# Altium footprint library ATROTECH.PcbLib: 334 footprints (part 6 of 21)
Each footprint in its own frame and in the unit in brackets; x right, y up, seen from the top. Pads: shape width x height; smd on the part's side, far side on the other; paste and mask are expansions set on the pad; w line width, h text height; cw(c..) or ccw(c..) is an arc to the next point about the centre after c.
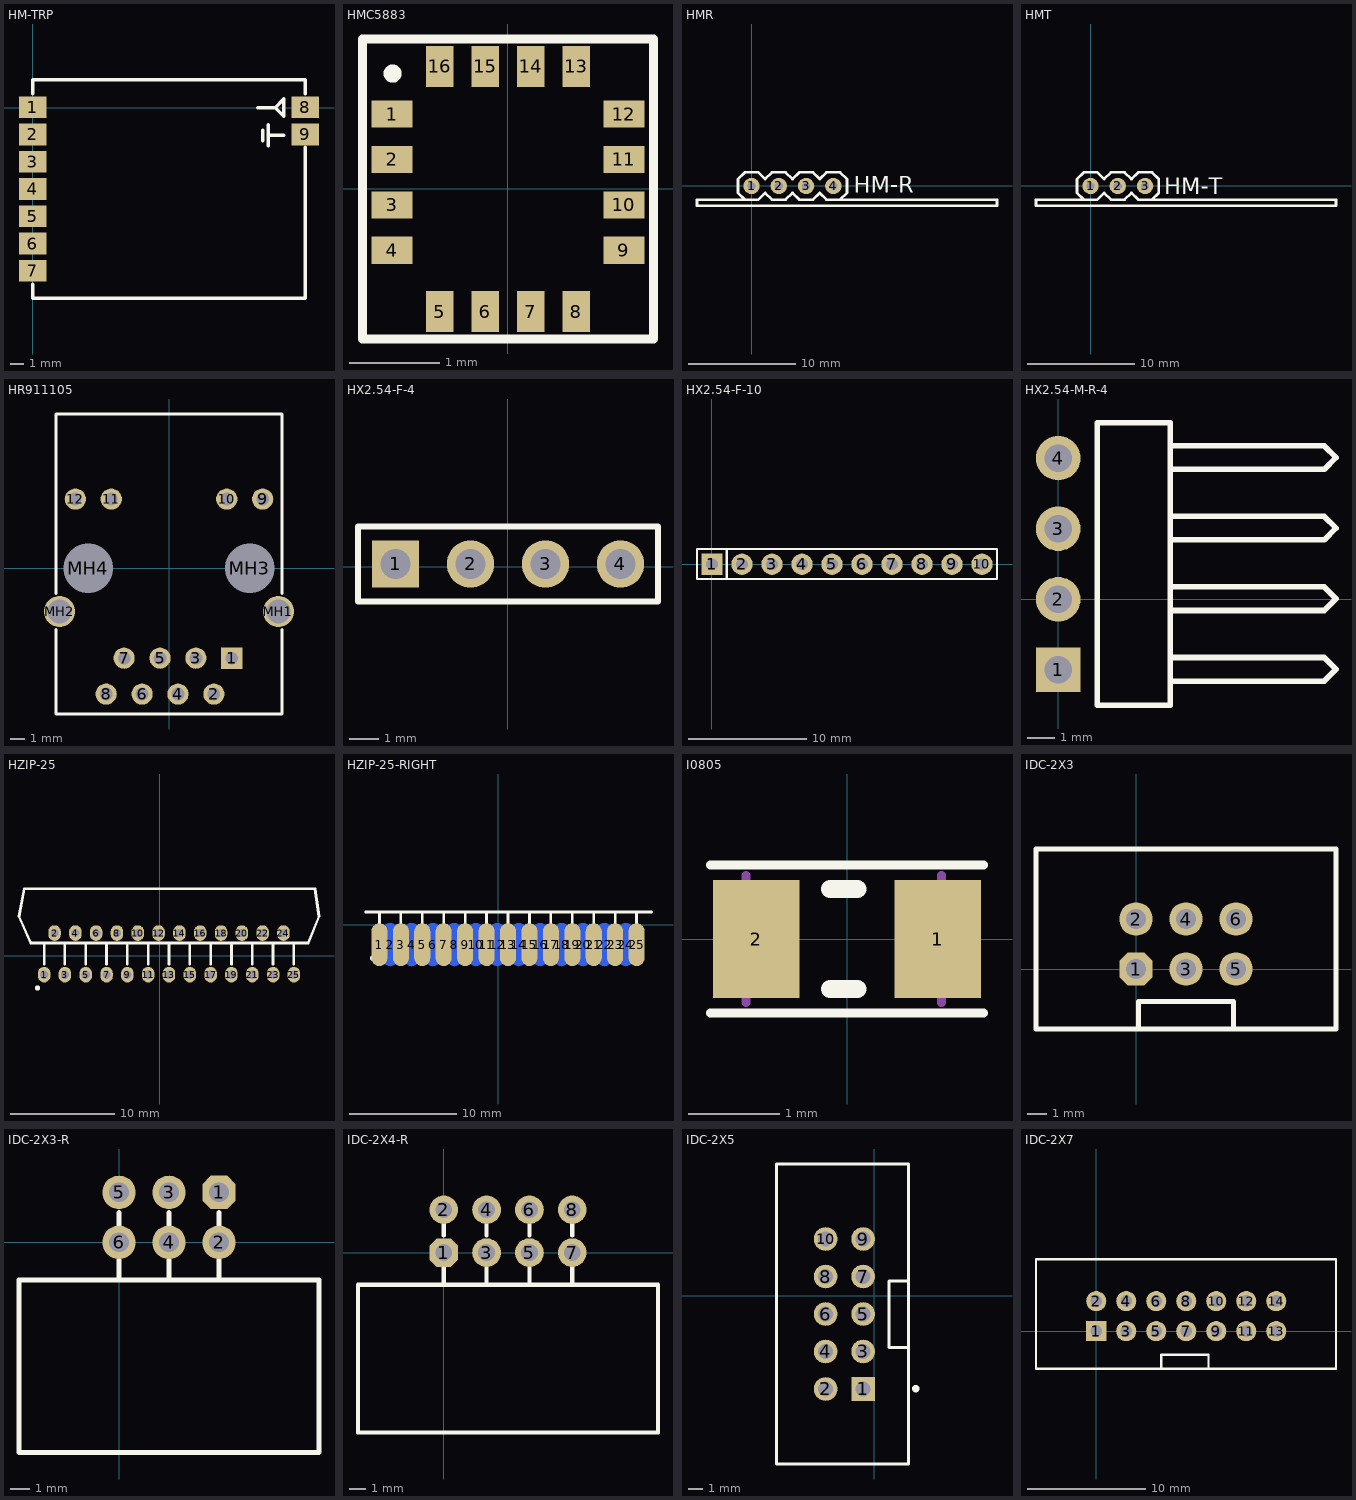
[diagram p5: the footprints below, top view; thin cyan lines are the x and y axes]

## HM-TRP [mm]
pads (9):
  rect 2x1.6 smd: 1(0,0.032) 2(0,-1.968) 3(0,-3.968) 4(0,-5.968) 5(0,-7.968) 6(0,-9.968) 7(0,-11.968) 8(20,0.032) 9(20,-1.968)
Top Overlay:
  lines w0.254: 0,-12.954 0,-13.968 20,-13.968 20,-2.921 ; 0,1.016 0,2.032 20,2.032 20,1.016 ; 16.51,0 17.78,0 ; 16.891,-2.413 16.891,-1.651 ; 17.272,-2.794 17.272,-1.27 ; 17.272,-2.032 18.415,-2.032 ; 17.78,0 18.415,0.635 18.415,-0.635 ; 17.78,0 18.415,-0.635 ; 17.78,0 18.415,-0.635
3D body "User Library-HM-TRP-868S.step": height 2, standoff -0.01, extent 0.033,-13.969 20.033,2.031

## HMC5883 [mm]
pads (16):
  rect 0.45x0.3 smd mask+0.01: 1(-1.275,0.825) 2(-1.275,0.325) 3(-1.275,-0.175) 4(-1.275,-0.675) 9(1.275,-0.675) 10(1.275,-0.175) 11(1.275,0.325) 12(1.275,0.825)
  rect 0.3x0.45 smd mask+0.01: 5(-0.75,-1.35) 6(-0.25,-1.35) 7(0.25,-1.35) 8(0.75,-1.35) 13(0.75,1.35) 14(0.25,1.35) 15(-0.25,1.35) 16(-0.75,1.35)
Top Overlay:
  circle w0.1: c-1.27,1.27 r0.05
  lines w0.1: -1.6,-1.651 1.6,-1.651 1.6,1.651 -1.6,1.651 -1.6,-1.651
3D body: height 0.8, standoff 0, extent -1.549,-1.6 1.549,1.6

## HMR [mil]
height 551.18
pads (4):
  round 60 hole 30: 1(0,0) 2(100,0) 3(200,0) 4(300,0)
Top Overlay:
  lines w10: -25,-50 25,-50 50,-25 75,-50 125,-50 150,-25 175,-50 225,-50 250,-25 275,-50 325,-50 ; -25,-50 -200,-50 -200,-72.17 900,-72.17 900,-50 325,-50 ; -25,-50 -50,-25 -50,25 -25,50 25,50 50,25 75,50 125,50 150,25 175,50 225,50 250,25 275,50 325,50 350,25 350,-25 325,-50
  text "HM-R" at 375,-25 h60

## HMT [mil]
height 551.18
pads (3):
  round 60 hole 30: 1(0,0) 2(100,0) 3(200,0)
Top Overlay:
  lines w10: -25,-50 25,-50 50,-25 75,-50 125,-50 150,-25 175,-50 225,-50 ; -25,-50 -200,-50 -200,-72.17 900,-72.17 900,-50 225,-50 ; -25,-50 -50,-25 -50,25 -25,50 25,50 50,25 75,50 125,50 150,25 175,50 225,50 250,25 250,-25 225,-50
  text "HM-T" at 270,-30 h60

## HR911105 [mm]
pads (16):
  rect 1.5x1.5 hole 0.9: 1(4.445,-6.35)
  round 1.5 hole 0.9: 2(3.175,-8.89) 3(1.905,-6.35) 4(0.635,-8.89) 5(-0.635,-6.35) 6(-1.905,-8.89) 7(-3.175,-6.35) 8(-4.445,-8.89) 9(6.625,4.9) 10(4.085,4.9) 11(-4.085,4.9) 12(-6.625,4.9)
  round 2.2 hole 1.7: MH1(7.745,-3.05) MH2(-7.745,-3.05)
  round 3.25 hole 3.5 unplated: MH3(5.715,0) MH4(-5.715,0)
Top Overlay:
  lines w0.2: -8.003,-1.778 -8,10.92 8,10.92 ; -8,-4.318 -8,-10.3 8,-10.3 ; 8.001,-10.3 8.001,-4.318 ; 8.004,-1.778 8.004,10.92
3D body "User Library-RJ45-01-J0011D01BNL.STEP": height 13.57, standoff -3.94, extent -8.271,-10.495 8.329,10.852

## HX2.54-F-4 [mm]
pads (4):
  rect 1.6x1.6 hole 1: 1(-3.8,0.1)
  round 1.6 hole 1: 2(-1.26,0.1) 3(1.28,0.1) 4(3.82,0.1)
Top Overlay:
  lines w0.2: -5.07,-1.17 5.09,-1.17 5.09,1.37 -5.07,1.37 -5.07,-1.17
3D body "User Library-HeaderRangLuocDonThang2_54mm (1).SLDPRT": height 8.5, standoff -3.2, extent -5.07,-1.2 5.09,1.34

## HX2.54-F-10 [mm]
pads (10):
  rect 1.8x1.8 hole 1: 1(0,0)
  round 1.8 hole 1: 2(2.54,0) 3(5.08,0) 4(7.62,0) 5(10.16,0) 6(12.7,0) 7(15.24,0) 8(17.78,0) 9(20.32,0) 10(22.86,0)
Top Overlay:
  lines w0.2: 1.25,-1.2 1.25,1.2 ; -1.27,-1.25 -1.27,1.29 24.13,1.29 24.13,-1.25 -1.27,-1.25
3D body "User Library-HeaderRangLuocDonThang2_54mm.SLDPRT": height 8.5, standoff -3.2, extent -1.27,-1.25 24.13,1.29

## HX2.54-M-R-4 [mm]
pads (4):
  rect 1.6x1.6 hole 1: 1(0,-2.54)
  round 1.6 hole 1: 2(0,0) 3(0,2.54) 4(0,5.08)
Top Overlay:
  lines w0.2: 4.04,-2.943 9.577,-2.943 10,-2.52 9.577,-2.097 4.04,-2.097 ; 4.04,-0.403 9.577,-0.403 10,0.02 9.577,0.443 4.04,0.443 ; 4.04,2.137 9.577,2.137 10,2.56 9.577,2.983 4.04,2.983 ; 4.04,4.677 9.577,4.677 10,5.1 9.577,5.523 4.04,5.523 ; 1.4,-3.81 2.54,-3.81 4.04,-3.81 4.04,6.35 2.54,6.35 1.4,6.35 1.4,-3.81
3D body "User Library-Header90-1.SLDPRT": height 2.67, standoff -2.87, extent -0.29,3.85 10.07,6.39
3D body "User Library-Header90-1.SLDPRT": height 2.67, standoff -2.87, extent -0.29,1.31 10.07,3.85
3D body "User Library-Header90-1.SLDPRT": height 2.67, standoff -2.87, extent -0.29,-1.23 10.07,1.31
3D body "User Library-Header90-1.SLDPRT": height 2.67, standoff -2.87, extent -0.29,-3.77 10.07,-1.23

## HZIP-25 [mm]
pads (25):
  oval 1.2x1.5 hole 0.8: 1(-11.096,-1.841) 2(-10.096,2.159) 3(-9.096,-1.841) 4(-8.096,2.159) 5(-7.096,-1.841) 6(-6.096,2.159) 7(-5.096,-1.841) 8(-4.096,2.159) 9(-3.096,-1.841) 10(-2.096,2.159) 11(-1.096,-1.841) 12(-0.096,2.159) 13(0.904,-1.841) 14(1.904,2.159) 15(2.904,-1.841) 16(3.904,2.159) 17(4.904,-1.841) 18(5.904,2.159) 19(6.906,-1.841) 20(7.906,2.159) 21(8.906,-1.841) 22(9.906,2.159) 23(10.906,-1.841) 24(11.906,2.159) 25(12.906,-1.841)
Top Overlay:
  circle w0.254: c-11.731,-3.111 r0.127
  lines w0.254: -11.096,-0.825 -11.096,1.08 ; -9.096,-0.825 -9.096,1.08 ; -7.096,-0.825 -7.096,1.08 ; -5.096,-0.825 -5.096,1.08 ; -3.096,-0.825 -3.096,1.08 ; -1.096,-0.825 -1.096,1.08 ; 0.904,-0.825 0.904,1.08 ; 2.904,-0.825 2.904,1.08 ; 4.904,-0.825 4.904,1.08 ; 6.906,-0.825 6.906,1.08 ; 8.906,-0.825 8.906,1.08 ; 10.906,-0.825 10.906,1.08 ; 12.906,-0.825 12.906,1.08 ; -13.509,3.747 -12.366,1.207 14.304,1.207 15.32,3.747 14.939,6.414 -13.001,6.414 -13.509,3.747
3D body "User Library-HZIP25-1_00F.step": height 19.73, standoff -2.77, extent -13.511,-2.06 15.289,6.35

## HZIP-25-RIGHT [mm]
pads (25):
  oval 1.5x4 smd: 1(-11.096,-1.841) 3(-9.096,-1.841) 5(-7.096,-1.841) 7(-5.096,-1.841) 9(-3.096,-1.841) 11(-1.096,-1.841) 13(0.904,-1.841) 15(2.904,-1.841) 17(4.904,-1.841) 19(6.906,-1.841) 21(8.906,-1.841) 23(10.906,-1.841) 25(12.906,-1.841)
  oval 1.5x4 smd far side: 2(-10.096,-1.841) 4(-8.096,-1.841) 6(-6.096,-1.841) 8(-4.096,-1.841) 10(-2.096,-1.841) 12(-0.096,-1.841) 14(1.904,-1.841) 16(3.904,-1.841) 18(5.904,-1.841) 20(7.906,-1.841) 22(9.906,-1.841) 24(11.906,-1.841)
Top Overlay:
  circle w0.254: c-11.731,-3.111 r0.127
  lines w0.254: -12.366,1.207 14.304,1.207 ; -11.096,-0.825 -11.096,1.08 ; -9.096,-0.825 -9.096,1.08 ; -7.096,-0.825 -7.096,1.08 ; -5.096,-0.825 -5.096,1.08 ; -3.096,-0.825 -3.096,1.08 ; -1.096,-0.825 -1.096,1.08 ; 0.904,-0.825 0.904,1.08 ; 2.904,-0.825 2.904,1.08 ; 4.904,-0.825 4.904,1.08 ; 6.906,-0.825 6.906,1.08 ; 8.906,-0.825 8.906,1.08 ; 10.906,-0.825 10.906,1.08 ; 12.906,-0.825 12.906,1.08
3D body "User Library-HZIP25-1_00F.step": height 2.16, standoff -6.25, extent -13.638,-1.055 15.162,21.445

## I0805 [mm]
pads (2):
  rect 0.95x1.3 smd: 1(1,0) 2(-1,0)
Top Overlay:
  lines w0.1: -1.5,-0.813 1.5,-0.813 ; -1.5,0.813 1.5,0.813
  lines w0.2: -0.188,-0.55 0.112,-0.55 ; -0.188,0.55 0.112,0.55
Mechanical 13:
  lines w0.1: -1.113,-0.7 -1.113,0.7 ; 1.037,-0.7 1.037,0.7
3D body "User Library-FB_2012.STEP": height 0.63, standoff -0.63, extent -1,-0.45 1,0.4

## IDC-2X3 [mm]
pads (6):
  oct 1.7x1.7 hole 1: 1(0,0)
  round 1.7 hole 1: 2(0,2.54) 3(2.54,0) 4(2.54,2.54) 5(5.08,0) 6(5.08,2.54)
Top Overlay:
  lines w0.254: 0.127,-3.048 0.127,-1.651 4.953,-1.651 4.953,-3.048 ; -5.08,-3.048 -5.08,6.096 10.16,6.096 10.16,-3.048 -5.08,-3.048
3D body "65714.stp": height 9.03, standoff -3.08, extent -5.1,-3.028 10.18,6.072

## IDC-2X3-R [mm]
pads (6):
  oct 1.7x1.7 hole 1: 1(5.08,2.54)
  round 1.7 hole 1: 2(5.08,0) 3(2.54,2.54) 4(2.54,0) 5(0,2.54) 6(0,0)
Top Overlay:
  lines w0.254: 0,-1.905 0,-0.889 ; 0,0.889 0,1.524 ; 2.54,-1.905 2.54,-0.889 ; 2.54,0.889 2.54,1.524 ; 5.08,-1.905 5.08,-0.889 ; 5.08,0.889 5.08,1.524 ; -5.08,-10.668 -5.08,-1.905 10.16,-1.905 10.16,-10.668 -5.08,-10.668
3D body "65715.stp": height 9.43, standoff -2.4, extent -5.1,-10.648 10.18,2.902

## IDC-2X4-R [mm]
pads (8):
  oct 1.7x1.7 hole 1: 1(0,0)
  round 1.7 hole 1: 2(0,2.54) 3(2.54,0) 4(2.54,2.54) 5(5.08,0) 6(5.08,2.54) 7(7.62,0) 8(7.62,2.54)
Top Overlay:
  lines w0.254: 0,-1.905 0,-0.889 ; 0,1.016 0,1.651 ; 2.54,-1.905 2.54,-0.889 ; 2.54,1.016 2.54,1.651 ; 5.08,-1.905 5.08,-0.889 ; 5.08,1.016 5.08,1.651 ; 7.62,-1.905 7.62,-0.889 ; 7.62,1.016 7.62,1.651 ; -5.08,-10.668 12.7,-10.668 12.7,-1.905 -5.08,-1.905 -5.08,-10.668
3D body "65719.stp": height 9.43, standoff -2.4, extent -5.1,-10.648 12.72,2.902

## IDC-2X5 [mm]
pads (10):
  rect 1.6x1.6 hole 1: 1(-0.762,-6.325)
  round 1.6 hole 1: 2(-3.302,-6.325) 3(-0.762,-3.785) 4(-3.302,-3.785) 5(-0.762,-1.245) 6(-3.302,-1.245) 7(-0.762,1.295) 8(-3.302,1.295) 9(-0.762,3.835) 10(-3.302,3.835)
Top Overlay:
  circle w0.25: c2.8,-6.3 r0.125
  lines w0.2: 2.3,-3.5 1,-3.5 1,1 2.3,1 ; -6.632,-11.405 -6.632,8.915 2.3,8.915 2.3,-11.405 -6.632,-11.405
Mechanical 13:
  lines w0.1: -6.632,-11.405 2.3,-11.405 2.3,8.915 -6.632,8.915 -6.632,-11.405
3D body "header_awhw10g-0202-t.STEP": height 9, standoff -3.5, extent -6.514,-11.405 2.286,8.915

## IDC-2X7 [mm]
pads (14):
  rect 1.7x1.7 hole 1: 1(0,0)
  round 1.7 hole 1: 2(0,2.54) 3(2.54,0) 4(2.54,2.54) 5(5.08,0) 6(5.08,2.54) 7(7.62,0) 8(7.62,2.54) 9(10.16,0) 10(10.16,2.54) 11(12.7,0) 12(12.7,2.54) 13(15.24,0) 14(15.24,2.54)
Top Overlay:
  lines w0.2: 5.5,-3.2 5.5,-2 9.5,-2 9.5,-3.2 ; -5.1,-3.2 -5.1,6.1 20.3,6.1 20.3,-3.2 -5.1,-3.2
3D body "User Library-IDC-14MS.STEP": height 9.25, standoff -3.45, extent -5.1,-3.175 20.3,6.175